# Altium footprint library pinghengche.PcbLib: 128 footprints (part 5 of 8)
Each footprint in its own frame and in the unit in brackets; x right, y up, seen from the top. Pads: shape width x height; smd on the part's side, far side on the other; paste and mask are expansions set on the pad; w line width, h text height; cw(c..) or ccw(c..) is an arc to the next point about the centre after c.
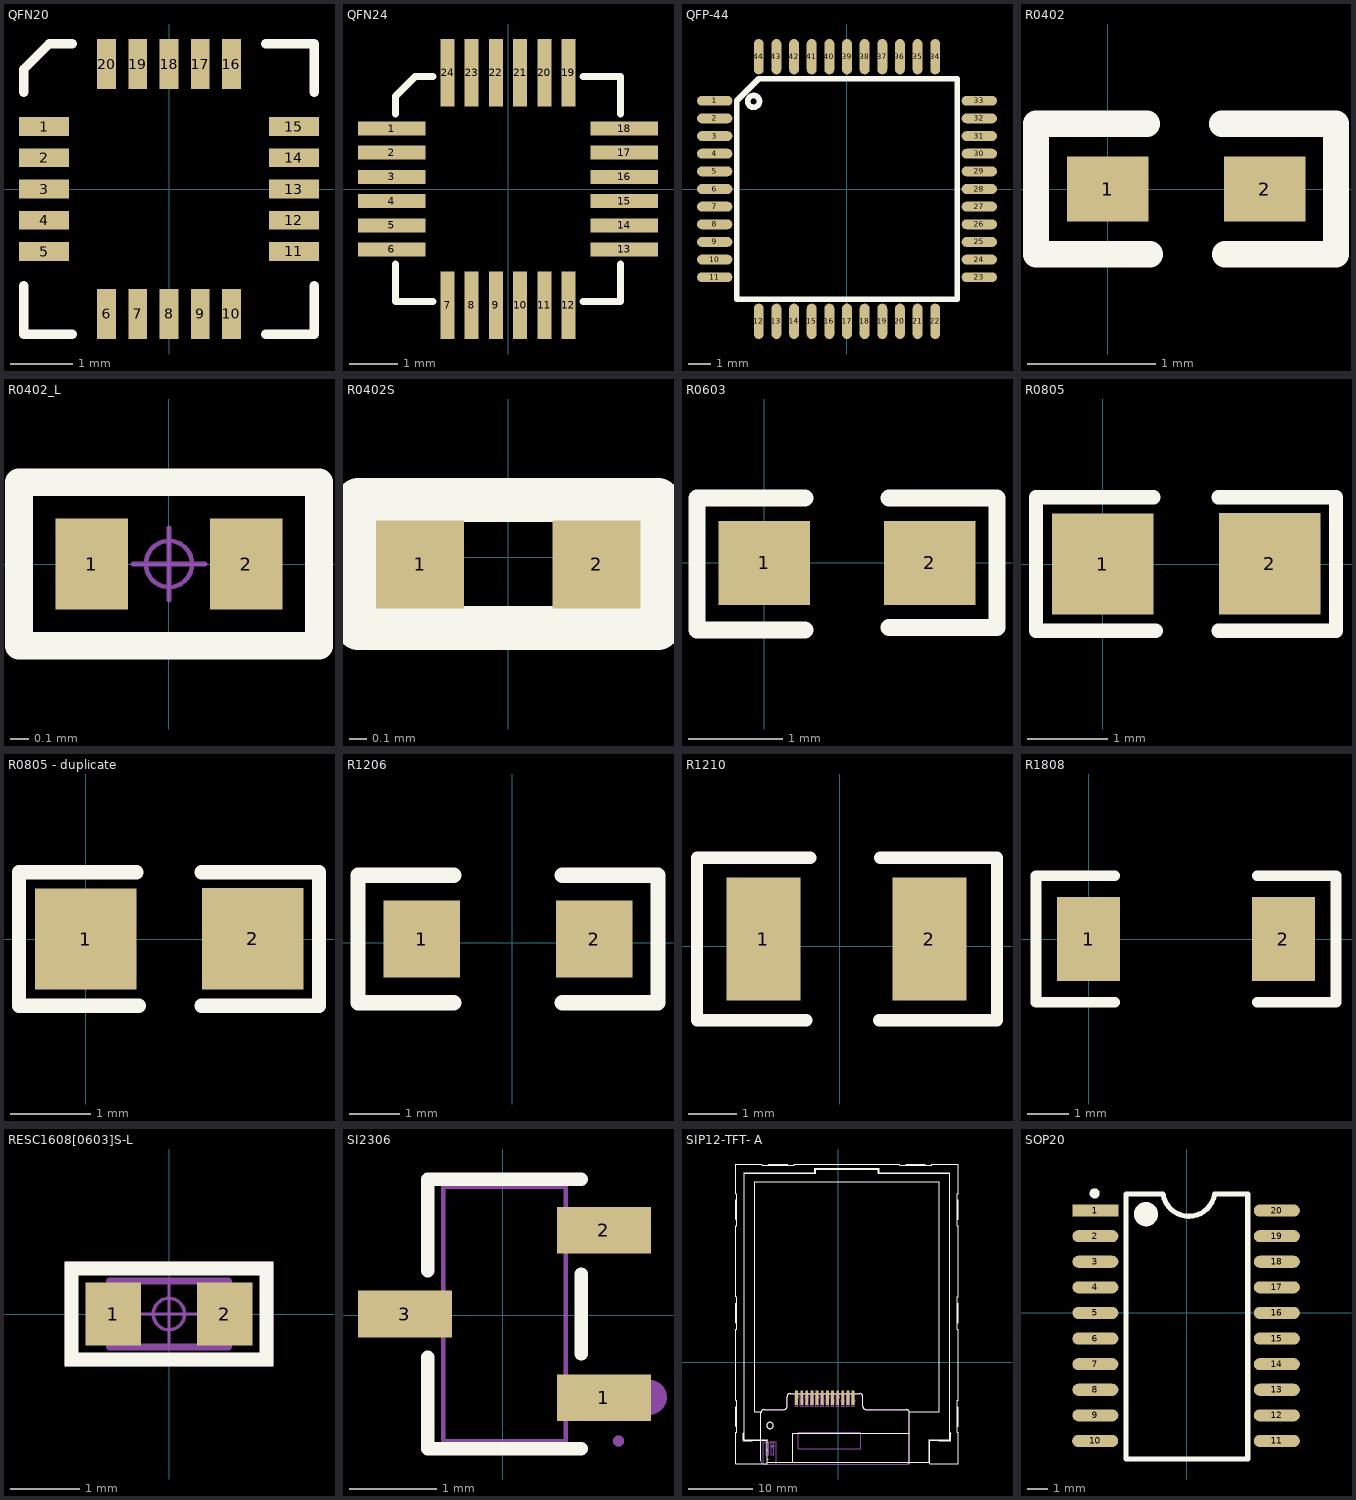
[diagram p4: the footprints below, top view; thin cyan lines are the x and y axes]

## QFN20 [mm]
pads (20):
  rect 0.8x0.3 smd: 1(-2,1) 2(-2,0.5) 3(-2,0) 4(-2,-0.5) 5(-2,-1) 11(2,-1) 12(2,-0.5) 13(2,0) 14(2,0.5) 15(2,1)
  rect 0.3x0.8 smd: 6(-1,-2) 7(-0.5,-2) 8(0,-2) 9(0.5,-2) 10(1,-2) 16(1,2) 17(0.5,2) 18(0,2) 19(-0.5,2) 20(-1,2)
Top Overlay:
  lines w0.15: -2.325,-1.55 -2.325,-2.325 -1.55,-2.325 ; -2.325,1.55 -2.325,1.917 -1.917,2.325 -1.55,2.325 ; 1.55,-2.325 2.325,-2.325 2.325,-1.55 ; 1.55,2.325 2.325,2.325 2.325,1.55
3D body "QFN-20.STEP": height 0.62, standoff -0.08, extent -1.501,-1.5 1.499,1.5

## QFN24 [mm]
pads (24):
  rect 1.4x0.29 smd: 1(-2.4,1.25) 2(-2.4,0.75) 3(-2.4,0.25) 4(-2.4,-0.25) 5(-2.4,-0.75) 6(-2.4,-1.25) 13(2.4,-1.25) 14(2.4,-0.75) 15(2.4,-0.25) 16(2.4,0.25) 17(2.4,0.75) 18(2.4,1.25)
  rect 0.29x1.4 smd: 7(-1.25,-2.4) 8(-0.75,-2.4) 9(-0.25,-2.4) 10(0.25,-2.4) 11(0.75,-2.4) 12(1.25,-2.4) 19(1.25,2.4) 20(0.75,2.4) 21(0.25,2.4) 22(-0.25,2.4) 23(-0.75,2.4) 24(-1.25,2.4)
Top Overlay:
  lines w0.15: -2.325,-1.55 -2.325,-2.325 -1.55,-2.325 ; -2.325,1.55 -2.325,1.917 -1.917,2.325 -1.55,2.325 ; 1.55,-2.325 2.325,-2.325 2.325,-1.55 ; 1.55,2.325 2.325,2.325 2.325,1.55
3D body "QFN24.step": height 0.9, standoff 0, extent -1.997,-2.002 2.007,2.002

## QFP-44 [mm]
pads (44):
  oval 1.6x0.45 smd: 1(-6,4) 2(-6,3.2) 3(-6,2.4) 4(-6,1.6) 5(-6,0.8) 6(-6,0) 7(-6,-0.8) 8(-6,-1.6) 9(-6,-2.4) 10(-6,-3.2) 11(-6,-4) 23(6,-4) 24(6,-3.2) 25(6,-2.4) 26(6,-1.6) 27(6,-0.8) 28(6,0) 29(6,0.8) 30(6,1.6) 31(6,2.4) 32(6,3.2) 33(6,4)
  oval 0.45x1.6 smd: 12(-4,-6) 13(-3.2,-6) 14(-2.4,-6) 15(-1.6,-6) 16(-0.8,-6) 17(0,-6) 18(0.8,-6) 19(1.6,-6) 20(2.4,-6) 21(3.2,-6) 22(4,-6) 34(4,6) 35(3.2,6) 36(2.4,6) 37(1.6,6) 38(0.8,6) 39(0,6) 40(-0.8,6) 41(-1.6,6) 42(-2.4,6) 43(-3.2,6) 44(-4,6)
Top Overlay:
  circle w0.254: c-4.232,3.972 r0.267
  lines w0.254: -5,-5 -5,4 -4,5 5,5 5,-5 -5,-5
3D body: height 1.15, standoff 0, extent -4.484,3.489 -3.488,4.487
3D body "User Library-44 pin tqfp ic package.STEP": height 1.1, standoff -0.01, extent -5.975,-5.975 6.025,6.025

## R0402 [mil] "1/16W"
pads (2):
  rect 25x20 smd: 1(0,0) 2(48.2,0)
Top Overlay:
  lines w8: 12,20 -22,20 -22,-20 13,-20 ; 35,20 70,20 70,-20 36,-20
3D body "R0402.STEP": height 13.78, standoff 0, extent 4.71,-9.79 44.09,9.9

## R0402_L [mm] "1/16W贴片电阻"
pads (2):
  rect 0.4x0.5 smd: 1(-0.425,0) 2(0.425,0)
Top Overlay:
  lines w0.152: -0.825,-0.45 -0.825,0.45 0.825,0.45 0.825,-0.45 -0.825,-0.45
Mechanical 15:
  circle w0.025: c0,0 r0.127
  lines w0.025: -0.2,0 0.2,0 ; 0,-0.2 0,0.2
3D body "R0402.STEP": height 0.3, standoff 0, extent -0.5,-0.25 0.5,0.25

## R0402S [mil] "1/16W"
pads (2):
  rect 20x20 smd: 1(-19.93,-1.58) 2(20.07,-1.58)
Top Overlay:
  lines w10: -34,-16 -34,13 34,13 34,-16 -34,-16
3D body "R0402.STEP": height 13.78, standoff 0, extent -19.59,-11.6 19.79,8.09

## R0603 [mil] "1/10W"
pads (2):
  rect 38x35 smd: 1(0,0) 2(69,0)
Top Overlay:
  lines w7: 17,-28 -28,-28 -28,27 17,27 ; 52,-27 97,-27 97,27 52,27
3D body "R0603.STEP": height 17.72, standoff 0, extent 3.51,-15.74 66.5,15.75

## R0805 [mm] "1/8W"
pads (2):
  rect 1.27x1.27 smd: 1(0,0) 2(2.09,0.005)
Top Overlay:
  lines w0.18: -0.838,0.813 -0.838,-0.838 0.66,-0.838 ; -0.838,0.838 0.635,0.838 ; 1.448,-0.838 2.921,-0.838 2.921,0.838 1.448,0.838
3D body "R0805.STEP": height 0.55, standoff 0, extent 0.036,-0.62 2.036,0.64

## R0805 - duplicate [mm] "1/8W"
pads (2):
  rect 1.27x1.27 smd: 1(0,0) 2(2.09,0.005)
Top Overlay:
  lines w0.18: -0.838,0.813 -0.838,-0.838 0.66,-0.838 ; -0.838,0.838 0.635,0.838 ; 1.448,-0.838 2.921,-0.838 2.921,0.838 1.448,0.838
3D body "R0805.STEP": height 0.55, standoff 0, extent 0.036,-0.62 2.036,0.64

## R1206 [mil] "1/4W"
pads (2):
  rect 60x60 smd: 1(-71,3) 2(64,3)
Top Overlay:
  lines w12: -46,-47 -121,-47 -121,53 -46,53 ; 39,-47 114,-47 114,53 39,53
3D body "R1206.STEP": height 23.62, standoff 0, extent -66.19,-28.4 59.79,34.59

## R1210 [mil] "1/3W"
pads (2):
  rect 60x100 smd: 1(-62,6) 2(73,6)
Top Overlay:
  lines w10: -27,-60 -116,-60 -116,72 -24,72 ; 32,-60 128,-60 128,72 ; 33,72 126.8,72
3D body "1210(3225M) Cap.STEP": height 67.1, standoff 0, extent -72.75,-44 84.75,54

## R1808 [mil]
pads (2):
  rect 60x80 smd: 1(0,0) 2(185,0)
Top Overlay:
  lines w10: 25,-60 -50,-60 -50,60 25,60 ; 160,-60 235,-60 235,60 160,60
3D body "R1808(4520M)1.STEP": height 39.37, standoff 0, extent 2,-39 179.77,37.49

## RESC1608[0603]S-L [mm]
height 2
pads (2):
  rect 0.8x0.9 smd: 1(-0.8,0) 2(0.8,0)
Top Overlay:
  region: 1.5,-0.75 1.5,0.75 1.3,0.75 1.3,-0.75
  rectangle: -1.5,-0.75 1.5,-0.55
  region: -1.5,0.75 -1.5,-0.75 -1.3,-0.75 -1.3,0.75
  rectangle: -1.5,0.55 1.5,0.75
Top Component Center:
  circle w0.05: c0,0 r0.225
  lines w0.05: -0.45,0 0.45,0 ; 0,-0.45 0,0.45
Top Component Outline:
  lines w0.05: -1.475,-0.725 -1.475,0.725 1.475,0.725 1.475,-0.725 -1.475,-0.725
Top Designator:
  text ".Designator" at -2.252,-0.226 h1
Mechanical 13:
  lines w0.1: -0.85,-0.475 -0.85,0.475 0.85,0.475 0.85,-0.475 -0.85,-0.475
3D body "R0603.STEP": height 0.45, standoff 0, extent -0.8,-0.4 0.8,0.4

## SI2306 [mm]
pads (3):
  rect 1.07x0.532 smd mask+0.051: 1(1.154,-0.943) 2(1.154,0.967) 3(-1.116,0.012)
Top Overlay:
  lines w0.152: -0.857,-0.482 -0.857,-1.524 0.895,-1.524 ; -0.857,0.507 -0.857,1.548 0.895,1.548 ; 0.895,-0.443 0.895,0.468
Mechanical 6:
  circle w0.2: c1.67,-0.938 r0.1
Mechanical 15:
  region: 0.969,-1.155 0.969,-0.73 1.319,-0.73 1.319,-1.155
  region: 0.709,-1.155 0.709,-0.73 0.979,-0.73 0.979,-1.155
  region: 0.969,0.755 0.969,1.18 1.319,1.18 1.319,0.755
  region: 0.709,0.755 0.709,1.18 0.979,1.18 0.979,0.755
  region: -1.281,-0.2 -1.281,0.225 -0.931,0.225 -0.931,-0.2
  region: -0.941,-0.2 -0.941,0.225 -0.671,0.225 -0.671,-0.2
  region: 1.379,-1.438 1.379,-1.413 1.344,-1.378 1.294,-1.378 1.259,-1.413 1.259,-1.438 1.259,-1.463 1.294,-1.498 1.344,-1.498 1.379,-1.463
  lines w0.051: -0.681,-1.438 0.719,-1.438 0.719,1.462 -0.681,1.462 -0.681,-1.438

## SIP12-TFT- A [mm]
pads (12):
  rect 0.43x2.3 smd: 1(2.305,-5.523) 2(1.505,-5.523) 3(0.705,-5.523) 4(-0.095,-5.523) 5(-0.895,-5.523) 6(-1.695,-5.523) 7(-2.495,-5.523) 8(-3.295,-5.523) 9(-4.095,-5.523) 10(-4.895,-5.523) 11(-5.695,-5.523) 12(-6.495,-5.523)
Top Overlay:
  circle w0.127: c-10.635,-9.83 r0.5
  lines w0.127: -15.793,-9.916 -15.993,-9.916 ; -15.793,-6.916 -15.993,-6.916 ; -15.793,6.184 -15.993,6.184 ; -15.793,9.184 -15.993,9.184 ; -15.793,22.284 -15.993,22.284 ; -15.793,25.284 -15.993,25.284 ; -14.243,-12.202 -14.243,-12.052 ; -12.036,-15.354 -12.036,-7.854 cw(c-11.536,-7.854) -11.536,-7.354 -8.476,-7.354 ccw(c-8.476,-6.854) -7.976,-6.854 -7.976,-5.354 cw(c-7.476,-5.354) -7.476,-4.854 3.324,-4.854 cw(c3.324,-5.354) 3.824,-5.354 3.824,-6.854 ccw(c4.324,-6.854) 4.324,-7.354 10.574,-7.354 cw(c10.574,-7.854) 11.074,-7.854 11.074,-15.516 ; -12.036,-7.696 -13.009,-7.696 -13.009,28.144 15.723,28.144 15.723,-7.696 11.074,-7.696 ; -11.043,-15.566 14.257,-15.566 ; -10.943,-15.516 14.157,-15.516 14.157,-12.052 17.323,-12.052 17.323,29.468 6.257,29.468 6.257,30.084 -3.543,30.084 -3.543,29.468 -14.609,29.468 -14.609,-12.052 -10.943,-12.052 ; -10.943,-15.066 -11.043,-15.066 -10.893,-15.066 ; -10.84,30.684 -10.84,30.884 ; -8.643,-15.566 -8.643,-15.516 ; -7.84,30.684 -7.84,30.884 ; -7.083,-15.494 -7.083,-11.002 11.057,-11.002 11.057,-15.824 ; 10.555,30.684 10.555,30.884 ; 11.857,-15.566 11.857,-15.516 ; 13.555,30.684 13.555,30.884 ; 14.107,-15.066 14.257,-15.066 14.157,-15.066 ; 17.157,-12.202 17.157,-12.052 ; 17.373,-4.466 17.373,22.214 ; 18.507,-9.916 18.707,-9.916 ; 18.507,-6.916 18.707,-6.916 ; 18.507,6.184 18.707,6.184 ; 18.507,9.184 18.707,9.184 ; 18.507,22.284 18.707,22.284 ; 18.507,25.284 18.707,25.284 ; -15.993,-9.916 -15.993,-6.916 ; -15.993,-9.916 -15.993,-6.916 ; -15.993,6.184 -15.993,9.184 ; -15.993,6.184 -15.993,9.184 ; -15.993,22.284 -15.993,25.284 ; -15.993,22.284 -15.993,25.284 ; -10.84,30.884 -7.84,30.884 ; -10.84,30.884 -7.84,30.884 ; 10.555,30.884 13.555,30.884 ; 10.555,30.884 13.555,30.884 ; 18.707,-9.916 18.707,-6.916 ; 18.707,-9.916 18.707,-6.916 ; 18.707,6.184 18.707,9.184 ; 18.707,6.184 18.707,9.184 ; 18.707,22.284 18.707,25.284 ; 18.707,22.284 18.707,25.284 ; -15.993,-15.816 -11.043,-15.816 -11.043,-12.102 -13.259,-12.102 -13.366,-12.202 -14.759,-12.202 -14.759,-11.062 -14.659,-10.898 -14.659,29.518 -3.643,29.518 -3.643,30.184 6.357,30.184 6.357,29.518 17.373,29.518 17.373,-10.898 17.473,-11.062 17.473,-12.202 15.657,-12.202 15.527,-12.102 14.257,-12.102 14.257,-15.816 18.707,-15.816 18.707,-10.916 18.507,-10.916 18.507,-5.916 18.707,-5.916 18.707,5.184 18.507,5.184 18.507,10.184 18.707,10.184 18.707,21.284 18.507,21.284 18.507,26.284 18.707,26.284 18.707,30.884 14.555,30.884 14.555,30.684 9.555,30.684 9.555,30.884 -6.84,30.884 -6.84,30.684 -11.84,30.684 -11.84,30.884 -15.993,30.884 -15.993,26.284 -15.793,26.284 -15.793,21.284 -15.993,21.284 -15.993,10.184 -15.793,10.184 -15.793,5.184 -15.993,5.184 -15.993,-5.916 -15.793,-5.916 -15.793,-10.916 -15.993,-10.916 -15.993,-15.816
Bottom Component Center:
  drawing of 186 lines, arcs and shapes, not listed
  text "K" at -11.202,-14.855 h0.41
  text "A" at -10.395,-14.839 h0.41
3D body "LCD.STEP": height 2.2, standoff 0, extent -15.9,-15.68 18.6,30.92

## SOP20 [mm]
height 2.36
pads (20):
  rect 2.286x0.6 smd: 1(-4.534,5.08)
  oval 2.286x0.6 smd: 2(-4.534,3.81) 3(-4.534,2.54) 4(-4.534,1.27) 5(-4.534,0) 6(-4.534,-1.27) 7(-4.534,-2.54) 8(-4.534,-3.81) 9(-4.534,-5.08) 10(-4.544,-6.35) 11(4.465,-6.35) 12(4.465,-5.08) 13(4.465,-3.81) 14(4.465,-2.54) 15(4.465,-1.27) 16(4.465,0) 17(4.465,1.27) 18(4.465,2.54) 19(4.465,3.81) 20(4.465,5.08)
Top Overlay:
  circle w0.25: c-4.575,5.93 r0.125
  circle w0.6: c-2.025,4.9 r0.3
  lines w0.254: -1.194,5.9 -3.025,5.9 -3.025,-7.239 3.025,-7.239 3.025,5.9 1.372,5.9 ; -1.17,5.844 ccw(c0.101,6.094) 1.372,5.842
3D body "User Library-SO-20 (Wide).step": height 2.7, standoff 0, extent -5.15,-7.009 5.15,5.791